# Altium footprint library First Board IMX6.PcbLib: 204 footprints (part 13 of 13)
Each footprint in its own frame and in the unit in brackets; x right, y up, seen from the top. Pads: shape width x height; smd on the part's side, far side on the other; paste and mask are expansions set on the pad; w line width, h text height; cw(c..) or ccw(c..) is an arc to the next point about the centre after c.
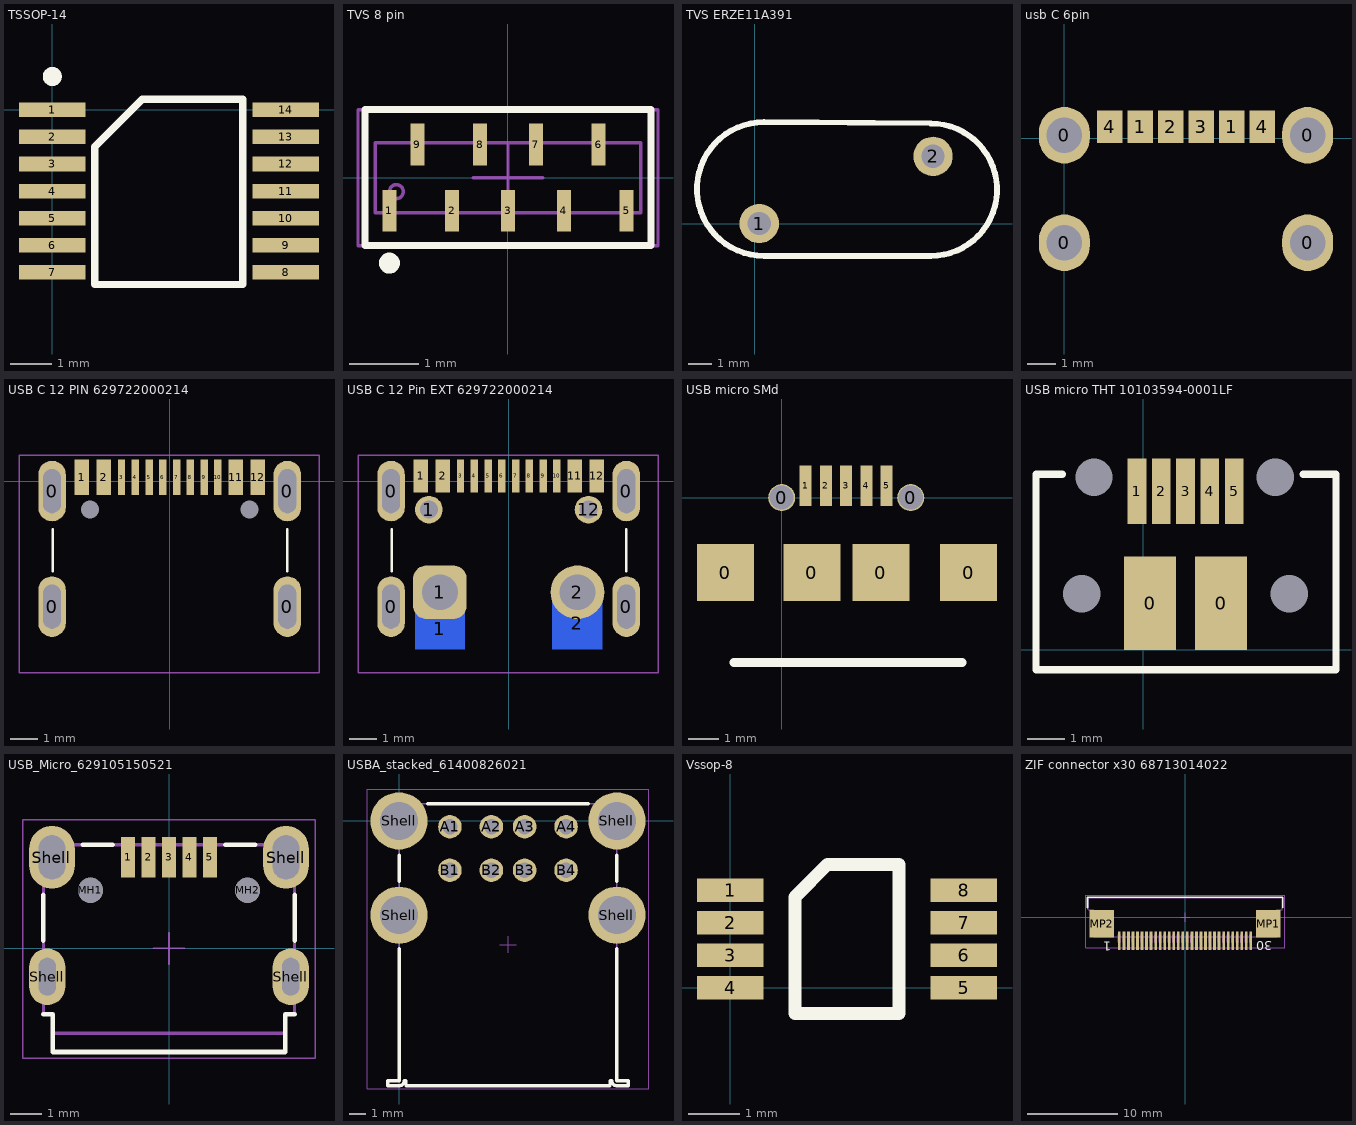
[diagram p12: the footprints below, top view; thin cyan lines are the x and y axes]

## TSSOP-14 [mm]
pads (14):
  rect 1.6x0.35 smd: 1(0,0) 2(0,-0.65) 3(0,-1.3) 4(0,-1.95) 5(0,-2.6) 6(0,-3.25) 7(0,-3.9) 8(5.6,-3.9) 9(5.6,-3.25) 10(5.6,-2.6) 11(5.6,-1.95) 12(5.6,-1.3) 13(5.6,-0.65) 14(5.6,0)
Top Overlay:
  circle w0.254: c0,0.8 r0.1
  lines w0.178: 1.016,-4.191 1.016,-0.884 2.154,0.254 4.572,0.254 4.572,-4.191 1.016,-4.191
3D body "TSSOP-14.step": height 1.1, standoff 0, extent -0.406,-4.456 5.994,0.544

## TVS 8 pin [mm]
pads (9):
  rect 0.2x0.6 smd: 1(-1.7,-0.475) 2(-0.8,-0.475) 3(0,-0.475) 4(0.8,-0.475) 5(1.7,-0.475) 6(1.3,0.475) 7(0.4,0.475) 8(-0.4,0.475) 9(-1.3,0.475)
Top Overlay:
  circle w0.15: c-1.7,-1.225 r0.075
  lines w0.1: -2.05,-0.975 2.05,-0.975 2.05,0.975 -2.05,0.975 -2.05,-0.975
Top Assembly:
  circle w0.05: c-1.6,-0.2 r0.1
  lines w0.05: -1.9,-0.5 -1.9,0.5 1.9,0.5 1.9,-0.5 -1.9,-0.5
  text ".Designator" at -2.499,-0.167 h0.5
Top Courtyard:
  lines w0.05: -0.5,0 0.5,0 ; 0,-0.5 0,0.5 ; -2.15,-0.975 2.15,-0.975 2.15,0.975 -2.15,0.975 -2.15,-0.975
Top 3D Body:
  circle w0.05: c-1.6,-0.2 r0.1
  lines w0.05: -1.9,-0.5 -1.9,0.5 1.9,0.5 1.9,-0.5 -1.9,-0.5
3D body "STEP-WE-TVS-DFN3810-9L-rev1.stp": height 0.5, standoff 0, extent -1.9,-0.5 1.9,0.5

## TVS ERZE11A391 [mm]
pads (2):
  round 1.7 hole 1: 1(0.2,0) 2(7.7,2.9)
Top Overlay:
  lines w0.254: 0.4,-1.4 7.6,-1.4 ccw(c7.6,1.46) 7.6,4.32 ; 0.4,-1.396 cw(c0.4,1.49) 0.4,4.376 ; 0.4,4.381 7.6,4.325

## usb C 6pin [mm]
pads (10):
  oval 1.8x2 hole 1.25 mask+0.1: 0(0,-3.7) 0(0,0.1) 0(8.6,-3.7) 0(8.6,0.1)
  rect 0.9x1.15 smd mask+0.1: 1(2.68,0.4) 1(5.92,0.4) 2(3.76,0.4) 3(4.84,0.4) 4(1.6,0.4) 4(7,0.4)
3D body "Type-C_6pin_Socket.step": height 3.38, standoff -0.33, extent -0.17,-6.3 8.77,0.6

## USB C 12 PIN 629722000214 [mm]
pads (18):
  oval 1x2.2 hole 0.65 slot 1.6 at 90 deg: 0(-4.275,-4.55) 0(-4.275,-0.35) 0(4.275,-4.55) 0(4.275,-0.35)
  rect 0.52x1.3 smd: 1(-3.2,0.15) 2(-2.4,0.15) 11(2.4,0.15) 12(3.2,0.15)
  rect 0.27x1.3 smd: 3(-1.75,0.15) 4(-1.25,0.15) 5(-0.75,0.15) 6(-0.25,0.15) 7(0.25,0.15) 8(0.75,0.15) 9(1.25,0.15) 10(1.75,0.15)
  round 0 hole 0.65: ""(-2.9,-1.025) ""(2.9,-1.025)
Top Overlay:
  lines w0.1: -4.25,-3.25 -4.25,-1.75 ; 4.275,-3.25 4.275,-1.75
Mechanical 11:
  text ".Designator" at -1.175,-3.5 h1.5
Mechanical 15:
  lines w0.05: -5.475,-6.95 -5.475,0.95 5.425,0.95 5.425,-6.95 -5.475,-6.95
3D body "USB C 629722000214 (rev1).stp": height 3.28, standoff -0.88, extent -4.765,-7.27 4.815,0.44

## USB C 12 Pin EXT 629722000214 [mm]
pads (22):
  oval 1x2.2 hole 0.65 slot 1.6 at 90 deg: 0(-4.275,-4.55) 0(-4.275,-0.35) 0(4.275,-4.55) 0(4.275,-0.35)
  rect 0.52x1.2 smd: 1(-3.2,0.2) 2(-2.4,0.2) 11(2.4,0.2) 12(3.2,0.2)
  round 1 hole 0.65 mask+0.102: 1(-2.9,-1.025) 12(2.9,-1.025)
  rect 1.8x1.5 smd far side: 1(-2.5,-5.355)
  rrect50% 1.95x1.95 hole 1.3 mask+0.102: 1(-2.5,-4.025)
  rect 1.8x1.9 smd far side: 2(2.49,-5.155)
  round 1.95 hole 1.3 mask+0.102: 2(2.5,-4.025)
  rect 0.27x1.2 smd: 3(-1.75,0.2) 4(-1.25,0.2) 5(-0.75,0.2) 6(-0.25,0.2) 7(0.25,0.2) 8(0.75,0.2) 9(1.25,0.2) 10(1.75,0.2)
Top Overlay:
  lines w0.1: -4.25,-3.25 -4.25,-1.75 ; 4.275,-3.25 4.275,-1.75
Mechanical 11:
  text ".Designator" at -1.175,-3.5 h1.5
Mechanical 15:
  lines w0.05: -5.475,-6.95 5.425,-6.95 5.425,0.95 -5.475,0.95 -5.475,-6.95
3D body "USB C 629722000214 (rev1).stp": height 3.28, standoff -0.88, extent -4.765,-7.27 4.815,0.44

## USB micro SMd [mm]
pads (11):
  rect 1.9x1.9 smd mask+0.1: 0(-1.875,-2.5) 0(1,-2.5) 0(3.3,-2.5) 0(6.225,-2.5)
  round 0.9 hole 0.8 mask+0.1: 0(0,0) 0(4.3,0)
  rect 0.4x1.35 smd mask+0.1: 1(0.8,0.4) 2(1.475,0.4) 3(2.15,0.4) 4(2.825,0.4) 5(3.5,0.4)
Top Overlay:
  lines w0.3: -1.6,-5.5 6,-5.5

## USB micro THT 10103594-0001LF [mm]
pads (11):
  round 0.1 hole 1 unplated: 0(-1.65,1.5) 0(-1.325,4.625) 0(3.525,4.625) 0(3.9,1.5)
  rect 1.4x2.5 smd: 0(0.175,1.25) 0(2.075,1.25)
  rect 0.5x1.75 smd: 1(-0.175,4.25) 2(0.475,4.25) 3(1.125,4.25) 4(1.775,4.25) 5(2.425,4.25)
Top Overlay:
  lines w0.2: -2.175,4.7 -2.875,4.7 -2.875,-0.525 5.15,-0.525 5.15,4.7 4.275,4.7
3D body "USB micro 10103594.STEP": height 3.15, standoff -0.45, extent -2.895,-1.324 5.145,4.709

## USB_Micro_629105150521 [mm]
pads (11):
  rect 0.45x1.3 smd: 1(-1.3,2.9) 2(-0.65,2.9) 3(0,2.9) 4(0.65,2.9) 5(1.3,2.9)
  round 0.8 hole 0.8 unplated: MH1(-2.5,1.85) MH2(2.5,1.85)
  oval 1.15x1.8 hole 0.55 slot 1.2 at 90 deg: Shell(-3.875,-0.9) Shell(3.875,-0.9)
  oval 1.45x2 hole 0.85 slot 1.4 at 90 deg: Shell(-3.725,2.9) Shell(3.725,2.9)
Top Overlay:
  lines w0.15: -4,-2.1 -3.7,-2.1 -3.7,-3.3 3.7,-3.3 3.7,-2.1 4,-2.1 ; -4,0.25 -4,1.7 ; -2.75,3.3 -1.8,3.3 ; 1.8,3.3 2.75,3.3 ; 4,0.25 4,1.7
Mechanical 2:
  lines w0.1: -3.7,-2.7 3.7,-2.7
  text "PCB Edge" at -1.3,-3.3 h0.41
Mechanical 11:
  lines w0.1: -4,-2.1 -4,3.3 4,3.3 4,-2.1 3.7,-2.1 3.7,-3.3 -3.7,-3.3 -3.7,-2.1 -4,-2.1
  text ".Designator" at -1.75,-0.75 h1.5
Mechanical 13:
  lines w0.1: -4,-2.1 -3.7,-2.1 -3.7,-3.3 3.7,-3.3 3.7,-2.1 4,-2.1 4,3.3 -4,3.3 -4,-2.1
Mechanical 15:
  lines w0.05: -0.5,0 0.5,0 ; 0,-0.5 0,0.5 ; -4.65,-3.5 -4.65,4.1 4.65,4.1 4.65,-3.5 -4.65,-3.5
3D body "629105150521.stp": height 2.75, standoff -1.77, extent -4,-3.3 4,3.303

## USBA_stacked_61400826021 [mm]
pads (12):
  round 1.42 hole 0.92: A1(3.07,-0.35) A2(5.57,-0.35) A3(7.57,-0.35) A4(10.07,-0.35) B1(3.07,-2.97) B2(5.57,-2.97) B3(7.57,-2.97) B4(10.07,-2.97)
  round 3.45 hole 2.3: Shell(0,-5.68) Shell(0,0) Shell(13.14,-5.68) Shell(13.14,0)
Top Overlay:
  lines w0.2: 0.02,-7.71 0.02,-15.66 -0.68,-15.66 -0.68,-15.96 0.01,-15.96 ccw(c0.02,-15.66) 0.32,-15.66 0.42,-15.66 0.42,-15.96 12.72,-15.96 12.72,-15.66 12.82,-15.66 ccw(c13.12,-15.66) 13.13,-15.96 13.82,-15.96 13.82,-15.66 13.12,-15.66 13.12,-7.71 ; 0.02,-3.65 0.02,-2.06 ; 1.72,1.04 11.42,1.04 ; 13.12,-3.65 13.12,-2.06
Mechanical 11:
  lines w0.1: -0.68,-15.96 -0.68,-15.66 0.02,-15.66 0.02,1.04 13.12,1.04 13.12,-15.66 13.82,-15.66 13.82,-15.96 13.13,-15.96 cw(c13.12,-15.66) 12.82,-15.66 12.72,-15.66 12.72,-15.96 0.42,-15.96 0.42,-15.66 0.32,-15.66 cw(c0.02,-15.66) 0.01,-15.96 -0.68,-15.96
Mechanical 13:
  lines w0.1: -0.68,-15.96 0.01,-15.96 ccw(c0.02,-15.66) 0.32,-15.66 0.42,-15.66 0.42,-15.96 12.72,-15.96 12.72,-15.66 12.82,-15.66 ccw(c13.12,-15.66) 13.13,-15.96 13.82,-15.96 13.82,-15.66 13.12,-15.66 13.12,1.04 0.02,1.04 0.02,-15.66 -0.68,-15.66 -0.68,-15.96
Mechanical 15:
  lines w0.05: 6.07,-7.46 7.07,-7.46 ; 6.57,-7.96 6.57,-6.96 ; -1.925,-16.16 15.065,-16.16 15.065,1.925 -1.925,1.925 -1.925,-16.16
3D body "61400826021.stp": height 15.99, standoff -3.86, extent -1.343,-15.96 14.483,1.19

## Vssop-8 [mil]
pads (8):
  rect 51.18x18 smd: 1(0,75) 2(0,50) 3(0,25) 4(0,0) 5(180,0) 6(180,25) 7(180,50) 8(180,75)
Top Overlay:
  lines w10: 50,-20 130,-20 130,95 75,95 50,70 50,-20
3D body "Vssop-8.step": height 43.31, standoff 0, extent -8.42,-22.06 188.43,96.05

## ZIF connector x30 68713014022 [mm]
pads (32):
  rect 0.3x2 smd: 1(-7.25,-2.585) 2(-6.75,-2.585) 3(-6.25,-2.585) 4(-5.75,-2.585) 5(-5.25,-2.585) 6(-4.75,-2.585) 7(-4.25,-2.585) 8(-3.75,-2.585) 9(-3.25,-2.585) 10(-2.75,-2.585) 11(-2.25,-2.585) 12(-1.75,-2.585) 13(-1.25,-2.585) 14(-0.75,-2.585) 15(-0.25,-2.585) 16(0.25,-2.585) 17(0.75,-2.585) 18(1.25,-2.585) 19(1.75,-2.585) 20(2.25,-2.585) 21(2.75,-2.585) 22(3.25,-2.585) 23(3.75,-2.585) 24(4.25,-2.585) 25(4.75,-2.585) 26(5.25,-2.585) 27(5.75,-2.585) 28(6.25,-2.585) 29(6.75,-2.585) 30(7.25,-2.585)
  rect 2.7x3 smd: MP1(9.18,-0.7) MP2(-9.18,-0.7)
Top Overlay:
  lines w0.2: -10.775,1.1 -10.775,2.225 10.775,2.225 10.775,1.1
  text "30" at 9.6,-2.625 h1.02
  text "1" at -8.125,-2.675 h1.02
Bottom Overlay:
  lines w0.254: -16.45,-9.375 -16.45,4.6 16.65,4.6 16.65,-9.375 -16.45,-9.375
Mechanical 11:
  lines w0.1: -7.35,-1.925 -7.35,-2.725 -7.15,-2.725 -7.15,-1.925 ; -6.85,-1.925 -6.85,-2.725 -6.65,-2.725 -6.65,-1.925 ; -6.35,-1.925 -6.35,-2.725 -6.15,-2.725 -6.15,-1.925 ; -5.85,-1.925 -5.85,-2.725 -5.65,-2.725 -5.65,-1.925 ; -5.35,-1.925 -5.35,-2.725 -5.15,-2.725 -5.15,-1.925 ; -4.85,-1.925 -4.85,-2.725 -4.65,-2.725 -4.65,-1.925 ; -4.35,-1.925 -4.35,-2.725 -4.15,-2.725 -4.15,-1.925 ; -3.85,-1.925 -3.85,-2.725 -3.65,-2.725 -3.65,-1.925 ; -3.35,-1.925 -3.35,-2.725 -3.15,-2.725 -3.15,-1.925 ; -2.85,-1.925 -2.85,-2.725 -2.65,-2.725 -2.65,-1.925 ; -2.35,-1.925 -2.35,-2.725 -2.15,-2.725 -2.15,-1.925 ; -1.85,-1.925 -1.85,-2.725 -1.65,-2.725 -1.65,-1.925 ; -1.35,-1.925 -1.35,-2.725 -1.15,-2.725 -1.15,-1.925 ; -0.85,-1.925 -0.85,-2.725 -0.65,-2.725 -0.65,-1.925 ; -0.35,-1.925 -0.35,-2.725 -0.15,-2.725 -0.15,-1.925 ; 0.15,-1.925 0.15,-2.725 0.35,-2.725 0.35,-1.925 ; 0.65,-1.925 0.65,-2.725 0.85,-2.725 0.85,-1.925 ; 1.15,-1.925 1.15,-2.725 1.35,-2.725 1.35,-1.925 ; 1.65,-1.925 1.65,-2.725 1.85,-2.725 1.85,-1.925 ; 2.15,-1.925 2.15,-2.725 2.35,-2.725 2.35,-1.925 ; 2.65,-1.925 2.65,-2.725 2.85,-2.725 2.85,-1.925 ; 3.15,-1.925 3.15,-2.725 3.35,-2.725 3.35,-1.925 ; 3.65,-1.925 3.65,-2.725 3.85,-2.725 3.85,-1.925 ; 4.15,-1.925 4.15,-2.725 4.35,-2.725 4.35,-1.925 ; 4.65,-1.925 4.65,-2.725 4.85,-2.725 4.85,-1.925 ; 5.15,-1.925 5.15,-2.725 5.35,-2.725 5.35,-1.925 ; 5.65,-1.925 5.65,-2.725 5.85,-2.725 5.85,-1.925 ; 6.15,-1.925 6.15,-2.725 6.35,-2.725 6.35,-1.925 ; 6.65,-1.925 6.65,-2.725 6.85,-2.725 6.85,-1.925 ; 7.15,-1.925 7.15,-2.725 7.35,-2.725 7.35,-1.925 ; -10.7,0.85 -10.1,0.85 -10.1,-2.15 10.1,-2.15 10.1,0.85 10.7,0.85 10.7,2.15 -10.7,2.15 -10.7,0.85
Mechanical 13:
  lines w0.1: -7.35,-1.925 -7.35,-2.725 -7.15,-2.725 -7.15,-1.925 ; -6.85,-1.925 -6.85,-2.725 -6.65,-2.725 -6.65,-1.925 ; -6.35,-1.925 -6.35,-2.725 -6.15,-2.725 -6.15,-1.925 ; -5.85,-1.925 -5.85,-2.725 -5.65,-2.725 -5.65,-1.925 ; -5.35,-1.925 -5.35,-2.725 -5.15,-2.725 -5.15,-1.925 ; -4.85,-1.925 -4.85,-2.725 -4.65,-2.725 -4.65,-1.925 ; -4.35,-1.925 -4.35,-2.725 -4.15,-2.725 -4.15,-1.925 ; -3.85,-1.925 -3.85,-2.725 -3.65,-2.725 -3.65,-1.925 ; -3.35,-1.925 -3.35,-2.725 -3.15,-2.725 -3.15,-1.925 ; -2.85,-1.925 -2.85,-2.725 -2.65,-2.725 -2.65,-1.925 ; -2.35,-1.925 -2.35,-2.725 -2.15,-2.725 -2.15,-1.925 ; -1.85,-1.925 -1.85,-2.725 -1.65,-2.725 -1.65,-1.925 ; -1.35,-1.925 -1.35,-2.725 -1.15,-2.725 -1.15,-1.925 ; -0.85,-1.925 -0.85,-2.725 -0.65,-2.725 -0.65,-1.925 ; -0.35,-1.925 -0.35,-2.725 -0.15,-2.725 -0.15,-1.925 ; 0.15,-1.925 0.15,-2.725 0.35,-2.725 0.35,-1.925 ; 0.65,-1.925 0.65,-2.725 0.85,-2.725 0.85,-1.925 ; 1.15,-1.925 1.15,-2.725 1.35,-2.725 1.35,-1.925 ; 1.65,-1.925 1.65,-2.725 1.85,-2.725 1.85,-1.925 ; 2.15,-1.925 2.15,-2.725 2.35,-2.725 2.35,-1.925 ; 2.65,-1.925 2.65,-2.725 2.85,-2.725 2.85,-1.925 ; 3.15,-1.925 3.15,-2.725 3.35,-2.725 3.35,-1.925 ; 3.65,-1.925 3.65,-2.725 3.85,-2.725 3.85,-1.925 ; 4.15,-1.925 4.15,-2.725 4.35,-2.725 4.35,-1.925 ; 4.65,-1.925 4.65,-2.725 4.85,-2.725 4.85,-1.925 ; 5.15,-1.925 5.15,-2.725 5.35,-2.725 5.35,-1.925 ; 5.65,-1.925 5.65,-2.725 5.85,-2.725 5.85,-1.925 ; 6.15,-1.925 6.15,-2.725 6.35,-2.725 6.35,-1.925 ; 6.65,-1.925 6.65,-2.725 6.85,-2.725 6.85,-1.925 ; 7.15,-1.925 7.15,-2.725 7.35,-2.725 7.35,-1.925 ; -10.7,0.85 -10.7,2.15 10.7,2.15 10.7,0.85 10.1,0.85 10.1,-2.15 -10.1,-2.15 -10.1,0.85 -10.7,0.85
Mechanical 15:
  lines w0.05: -0.5,0 0.5,0 ; 0,-0.5 0,0.5 ; -10.975,-3.36 10.975,-3.36 10.975,2.425 -10.975,2.425 -10.975,-3.36
3D body "68713014022.stp": height 2.1, standoff 0, extent -10.7,-2.95 10.7,2.15